# Altium footprint library PcbLib.PcbLib: 141 footprints (part 5 of 9)
Each footprint in its own frame and in the unit in brackets; x right, y up, seen from the top. Pads: shape width x height; smd on the part's side, far side on the other; paste and mask are expansions set on the pad; w line width, h text height; cw(c..) or ccw(c..) is an arc to the next point about the centre after c.
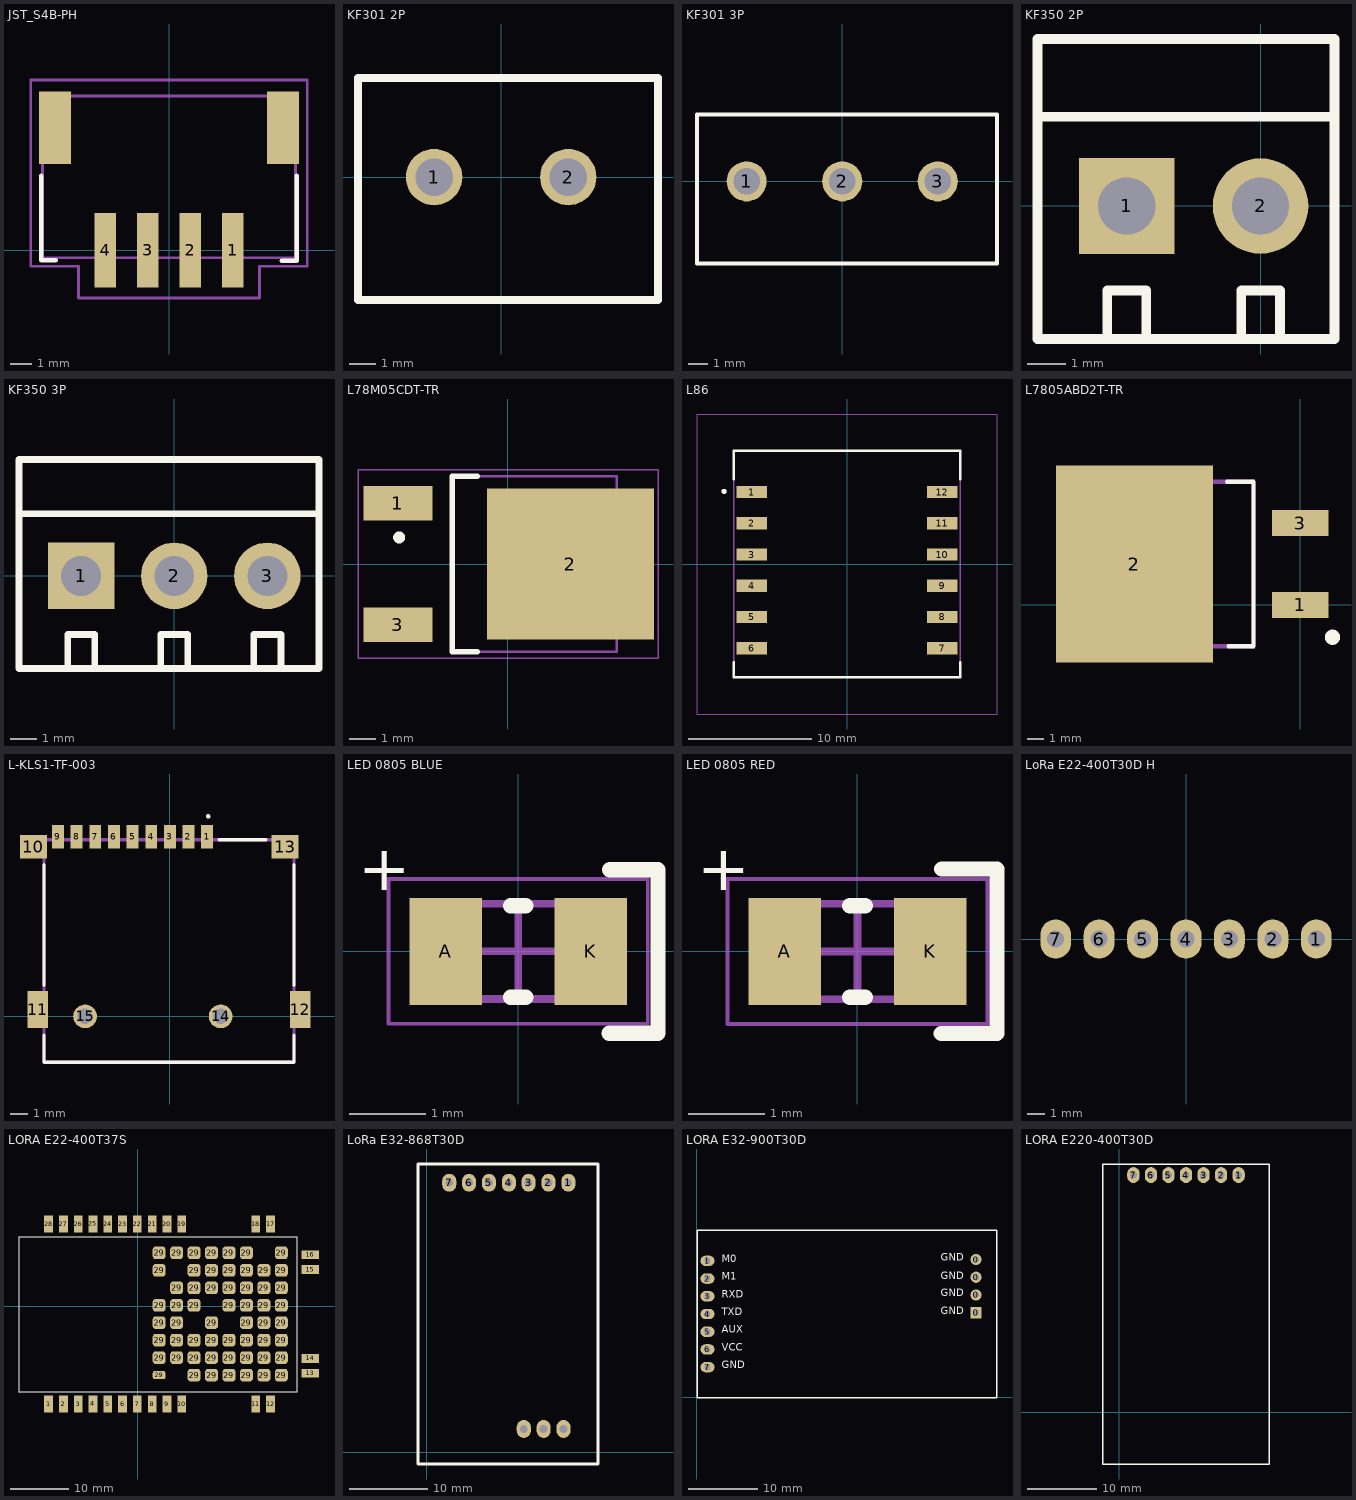
[diagram p4: the footprints below, top view; thin cyan lines are the x and y axes]

## JST_S4B-PH [mm]
pads (6):
  rect 1x3.5 smd: 1(3,0) 2(1,0) 3(-1,0) 4(-3,0)
  rect 1.5x3.4 smd: ""(-5.35,5.75) ""(5.35,5.75)
Top Overlay:
  lines w0.2: -6,3.5 -6,-0.472 -5.324,-0.472 ; 5.3,-0.5 5.95,-0.5 ; 6,-0.5 6,3.5
Mechanical 13:
  lines w0.127: -5.95,-0.35 -5.95,7.25 5.95,7.25 5.95,-0.35 -5.95,-0.35
Mechanical 15:
  lines w0.127: -6.5,-0.75 -6.5,8 6.5,8 6.5,-0.75 4.25,-0.75 4.25,-2.25 -4.25,-2.25 -4.25,-0.75 -6.5,-0.75
3D body "step_temp.STEP": height 5.5, standoff -0.1, extent -5.823,-1.379 6.077,7.221

## KF301 2P [mm] "2 Pin 5mm Terminal"
pads (2):
  round 2.1 hole 1.4: 1(-2.5,0) 2(2.5,0)
Top Overlay:
  lines w0.3: -5.334,-4.572 5.842,-4.572 5.842,3.683 -5.334,3.683 -5.334,-4.572
3D body "KF301-2P.stp": height 10, standoff -4.5, extent -5,-4.131 5.5,3.369

## KF301 3P [mm] "3 Pin 5mm Terminal"
pads (3):
  round 2.1 hole 1.4: 1(-5,0) 2(0,0) 3(5,0)
Top Overlay:
  lines w0.2: -7.6,-4.3 -7.6,3.5 8.1,3.5 8.1,-4.3 -7.6,-4.3
3D body "KF301-3P.stp": height 10.01, standoff -3.99, extent -7.446,-4.191 7.954,3.309

## KF350 2P [mm]
pads (2):
  rect 2.5x2.5 hole 1.5: 1(-3.5,0)
  round 2.5 hole 1.5: 2(0,0)
Top Overlay:
  lines w0.254: -5.837,2.337 1.936,2.337 ; -4.008,-3.48 -4.008,-2.21 -2.992,-2.21 -2.992,-3.48 ; -0.508,-3.48 -0.508,-2.21 0.508,-2.21 0.508,-3.48 ; -5.837,-3.48 -5.837,4.369 1.936,4.369 1.936,-3.48 -5.837,-3.48
3D body "KF350.STEP": height 10, standoff -3.8, extent -5.647,-3.344 -1.747,4.156
3D body "KF350.STEP": height 10, standoff -3.8, extent -2.147,-3.344 1.753,4.156

## KF350 3P [mm]
pads (3):
  rect 2.5x2.5 hole 1.5: 1(-3.5,0)
  round 2.5 hole 1.5: 2(0,0) 3(3.5,0)
Top Overlay:
  lines w0.254: -5.837,2.337 5.441,2.337 ; -4.008,-3.48 -4.008,-2.21 -2.992,-2.21 -2.992,-3.48 ; -0.508,-3.48 -0.508,-2.21 0.508,-2.21 0.508,-3.48 ; 2.992,-3.48 2.992,-2.21 4.008,-2.21 4.008,-3.48 ; -5.837,-3.48 -5.837,4.369 5.441,4.369 5.441,-3.48 -5.837,-3.48
3D body "KF350.STEP": height 10, standoff -3.8, extent 1.353,-3.343 5.253,4.156
3D body "KF350.STEP": height 10, standoff -3.8, extent -2.147,-3.344 1.753,4.156
3D body "KF350.STEP": height 10, standoff -3.8, extent -5.647,-3.344 -1.747,4.156

## L78M05CDT-TR [mm]
height 2.4
pads (3):
  rect 2.6x1.3 smd: 1(-4.15,2.28) 3(-4.15,-2.28)
  rect 6.3x5.7 smd: 2(2.35,0)
Top Overlay:
  circle w0.25: c-4.1,1 r0.1
  lines w0.2: -1.15,-3.3 -2.1,-3.3 -2.1,3.3 -1.15,3.3
Mechanical 13:
  lines w0.1: -2.1,-3.3 -2.1,3.3 4.1,3.3 4.1,-3.3 -2.1,-3.3
Mechanical 15:
  lines w0.05: -5.65,-3.55 -5.65,3.55 5.65,3.55 5.65,-3.55 -5.65,-3.55
  lines w0.1: -0.5,0 0.5,0 ; 0,-0.5 0,0.5
3D body "User Library-DPAK-1.STEP": height 2.34, standoff -0.07, extent -4.894,-3.25 5.044,3.29

## L86 [mm]
pads (12):
  rect 2.5x1 smd paste-2: 1(-7.75,5.85) 2(-7.75,3.31) 3(-7.75,0.77) 4(-7.75,-1.77) 5(-7.75,-4.31) 6(-7.75,-6.85) 7(7.75,-6.85) 8(7.75,-4.31) 9(7.75,-1.77) 10(7.75,0.77) 11(7.75,3.31) 12(7.75,5.85)
Top Overlay:
  circle w0.2: c-10,5.9 r0.1
  lines w0.2: -9.2,-8 -9.2,-9.2 9.2,-9.2 9.2,-8 ; -9.2,6.9 -9.2,9.2 9.2,9.2 9.2,6.9
Top Paste:
  drawing of 12 lines, arcs and shapes, not listed
Mechanical 13:
  circle w0.2: c-10,5.9 r0.1
  lines w0.127: -9.2,-9.2 9.2,-9.2 9.2,9.2 -9.2,9.2 -9.2,-9.2
Mechanical 15:
  lines w0.05: -12.2,-12.2 12.2,-12.2 12.2,12.2 -12.2,12.2 -12.2,-12.2
3D body "step_temp.STEP": height 7.15, standoff 0, extent -9.2,-9.2 9.2,9.2

## L7805ABD2T-TR [mm]
pads (3):
  rect 3.5x1.6 smd: 1(0,0) 3(0,5.08)
  rect 9.75x12.2 smd: 2(-10.275,2.54)
Top Overlay:
  circle w0.5: c2,-2 r0.219
  lines w0.254: -4.548,7.64 -2.904,7.64 -2.904,-2.56 -4.439,-2.56
Mechanical 13:
  lines w0.254: -12.054,-2.56 -2.904,-2.56 -2.904,7.64 -12.054,7.64 -12.054,-2.56
3D body "L7805ABD2T-TR.stp": height 4.6, standoff 0, extent -14.549,-2.642 1.343,7.722

## L-KLS1-TF-003 [mm] "Micro SD Card Connector"
pads (15):
  rect 0.7x1.4 smd: 1(2.2,10.6) 2(1.1,10.6) 3(0,10.6) 4(-1.1,10.6) 5(-2.2,10.6) 6(-3.3,10.6) 7(-4.4,10.6) 8(-5.5,10.6) 9(-6.6,10.6)
  rect 1.6x1.4 smd: 10(-8.05,10) 13(6.8,10)
  rect 1.2x2.2 smd: 11(-7.8,0.4) 12(7.7,0.4)
  round 1.4 hole 0.9: 14(3,0) 15(-5,0)
Top Overlay:
  circle w0.2: c2.261,11.802 r0.034
  lines w0.2: -7.425,-1.104 -7.425,-2.706 7.325,-2.706 7.325,-1.104 ; -7.425,1.835 -7.425,8.95 ; 2.9,10.431 5.648,10.431 ; 7.325,1.835 7.325,8.95
Mechanical 13:
  lines w0.2: -7.425,-2.706 7.325,-2.706 7.325,10.431 -7.425,10.431 -7.425,-2.706
3D body "L-KLS1-TF-003-H1.85-R.stp": height 1.93, standoff -0.52, extent -7.999,-3.918 8.101,11.284

## LED 0805 BLUE [mm]
height 0.8
pads (2):
  rect 0.95x1.4 smd: A(-0.95,0) K(0.95,0)
Top Overlay:
  lines w0.2: -0.1,-0.6 0.1,-0.6 ; -0.1,0.6 0.1,0.6 ; 1.196,-1.075 1.835,-1.075 1.835,1.071 1.202,1.071
  text "+" at -2.1,0.8 h0.6
Top Courtyard:
  lines w0.05: -1.7,-0.95 1.7,-0.95 1.7,0.95 -1.7,0.95 -1.7,-0.95
  lines w0.1: -0.5,0 0.5,0 ; 0,-0.5 0,0.5
Top Assembly:
  lines w0.1: -1,-0.625 1,-0.625 1,0.625 -1,0.625 -1,-0.625
3D body "LED_0805_BLUE.step": height 1.12, standoff 0.01, extent -1,-0.625 1,0.625

## LED 0805 RED [mm]
height 0.8
pads (2):
  rect 0.95x1.4 smd: A(-0.95,0) K(0.95,0)
Top Overlay:
  lines w0.2: -0.1,-0.6 0.1,-0.6 ; -0.1,0.6 0.1,0.6 ; 1.096,-1.074 1.826,-1.074 1.826,1.08 1.102,1.08
  text "+" at -2.1,0.8 h0.6
Top Courtyard:
  lines w0.05: -1.7,-0.95 1.7,-0.95 1.7,0.95 -1.7,0.95 -1.7,-0.95
  lines w0.1: -0.5,0 0.5,0 ; 0,-0.5 0,0.5
Top Assembly:
  lines w0.1: -1,-0.625 1,-0.625 1,0.625 -1,0.625 -1,-0.625
3D body "LED0805RED.STEP": height 1.12, standoff 0.01, extent -1,-0.625 1,0.625

## LoRa E22-400T30D H [mm]
pads (7):
  oval 1.8x2.3 hole 1: 1(7.62,0) 2(5.08,0) 3(2.54,0) 4(0,0) 5(-2.54,0) 6(-5.08,0) 7(-7.62,0)

## LORA E22-400T37S [mm]
pads (85):
  rect 1.5x3 smd: 1(-15.291,-16.815) 2(-12.751,-16.815) 3(-10.211,-16.815) 4(-7.671,-16.815) 5(-5.131,-16.815) 6(-2.591,-16.815) 7(-0.051,-16.815) 8(2.489,-16.815) 9(5.029,-16.815) 10(7.569,-16.815) 11(20.269,-16.815) 12(22.809,-16.815) 17(22.809,14.085) 18(20.269,14.085) 19(7.569,14.085) 20(5.029,14.085) 21(2.489,14.085) 22(-0.051,14.085) 23(-2.591,14.085) 24(-5.131,14.085) 25(-7.671,14.085) 26(-10.211,14.085) 27(-12.751,14.085) 28(-15.291,14.085)
  rect 3x1.5 smd: 13(29.629,-11.525) 14(29.629,-8.985) 15(29.629,6.255) 16(29.629,8.795)
  rrect50% 2.2x1.4 smd: 29(3.679,-11.865)
  rrect50% 2.2x2.2 smd: 29(3.679,-8.865) 29(3.679,-5.865) 29(3.679,-2.865) 29(3.679,0.135) 29(3.679,6.135) 29(3.679,9.135) 29(6.679,-8.865) 29(6.679,-5.865) 29(6.679,-2.865) 29(6.679,0.135) 29(6.679,3.135) 29(6.679,9.135) 29(9.679,-11.865) 29(9.679,-8.865) 29(9.679,-5.865) 29(9.679,0.135) 29(9.679,3.135) 29(9.679,6.135) 29(9.679,9.135) 29(12.679,-11.865) 29(12.679,-8.865) 29(12.679,-5.865) 29(12.679,-2.865) 29(12.679,3.135) 29(12.679,6.135) 29(12.679,9.135) 29(15.679,-11.865) 29(15.679,-8.865) 29(15.679,-5.865) 29(15.679,0.135) 29(15.679,3.135) 29(15.679,6.135) 29(15.679,9.135) 29(18.679,-11.865) 29(18.679,-8.865) 29(18.679,-5.865) 29(18.679,-2.865) 29(18.679,0.135) 29(18.679,3.135) 29(18.679,6.135) 29(18.679,9.135) 29(21.679,-11.865) 29(21.679,-8.865) 29(21.679,-5.865) 29(21.679,-2.865) 29(21.679,0.135) 29(21.679,6.135) 29(21.679,3.135) 29(24.679,-11.865) 29(24.679,-8.865) 29(24.679,-5.865) 29(24.679,-2.865) 29(24.679,0.135) 29(24.679,3.135) 29(24.679,6.135) 29(24.679,9.135)
Top Overlay:
  lines w0.203: -20.371,11.9 27.4,11.9 ; -20.371,11.9 -20.371,-14.785 27.4,-14.685 27.4,11.9 ; -20.371,11.9 27.4,11.9 ; -20.371,11.9 -20.371,-14.7 27.4,-14.7 27.4,11.9
3D body "E22-400T37S.stp": height 4.6, standoff 0, extent -20.3,-16.73 29.7,14.17

## LoRa E32-868T30D [mm]
pads (10):
  oval 1.8x2.3 hole 1: 1(18.12,34.5) 2(15.58,34.5) 3(13.04,34.5) 4(10.5,34.5) 5(7.96,34.5) 6(5.42,34.5) 7(2.88,34.5) ""(12.42,3) ""(14.96,3) ""(17.5,3)
Top Overlay:
  lines w0.4: -1.1,-1.5 -1.1,36.9 21.9,36.9 21.9,-1.5 -1.1,-1.5
Bottom Overlay:
  text "GND" at 2.4,29.7 h1
  text "VCC" at 4.9,29.7 h1
  text "AUX" at 7.4,29.7 h1
  text "TXD" at 9.9,29.7 h1
  text "RXD" at 12.5,29.7 h1
  text "M1" at 15.2,31.033 h1
  text "M0" at 17.7,30.7 h1
3D body "LoRaE32.STEP": height 8.55, standoff -5.99, extent -0.1,-12.88 20.9,35.9

## LORA E32-900T30D [mm]
pads (11):
  rect 1.6x1.6 hole 0.9: 0(40.024,12.155)
  round 1.6 hole 0.9: 0(40.024,14.695) 0(40.024,17.235) 0(40.024,19.775)
  oval 2x1.5 hole 0.9: 1(1.524,19.585) 2(1.524,17.045) 3(1.524,14.505) 4(1.524,11.965) 5(1.524,9.425) 6(1.524,6.885) 7(1.524,4.345)
Top Overlay:
  lines w0.2: 0.024,-0.035 0.024,23.965 43.024,23.965 43.024,-0.035 0.024,-0.035
  text "GND" at 34.981,11.584 h1.8
  text "GND" at 34.981,19.204 h1.8
  text "GND" at 34.95,16.569 h1.8
  text "GND" at 34.95,14.156 h1.8
  text "GND" at 3.587,3.805 h1.8
  text "VCC" at 3.587,6.345 h1.8
  text "AUX" at 3.587,8.885 h1.8
  text "TXD" at 3.587,11.425 h1.8
  text "RXD" at 3.587,13.965 h1.8
  text "M1" at 3.587,16.505 h1.8
  text "M0" at 3.587,19.045 h1.8
3D body "E22-400T30D.STEP": height 7.8, standoff -5.82, extent 0.15,-0.1 55.65,23.9

## LORA E220-400T30D [mm]
pads (7):
  oval 1.8x2.3 hole 1: 1(17.32,34.4) 2(14.78,34.4) 3(12.24,34.4) 4(9.7,34.4) 5(7.16,34.4) 6(4.62,34.4) 7(2.08,34.4)
Top Overlay:
  lines w0.2: -2.4,-7.5 21.8,-7.5 21.8,36 -2.4,36 -2.4,-7.5
Bottom Overlay:
  text "M0" at 16.9,30.6 h1
  text "M1" at 14.4,30.933 h1
  text "RXD" at 11.7,29.6 h1
  text "TXD" at 9.1,29.6 h1
  text "AUX" at 6.6,29.6 h1
  text "VCC" at 4.1,29.6 h1
  text "GND" at 1.6,29.6 h1
3D body "E22-400T30D.STEP": height 7.8, standoff -5.82, extent -2.3,-19.6 21.7,35.9